# Altium integrated library WCAP-AIL5_rev15a.intlib: 39 symbols
Pins are listed as number, name and electrical type; pins without a type are passive.

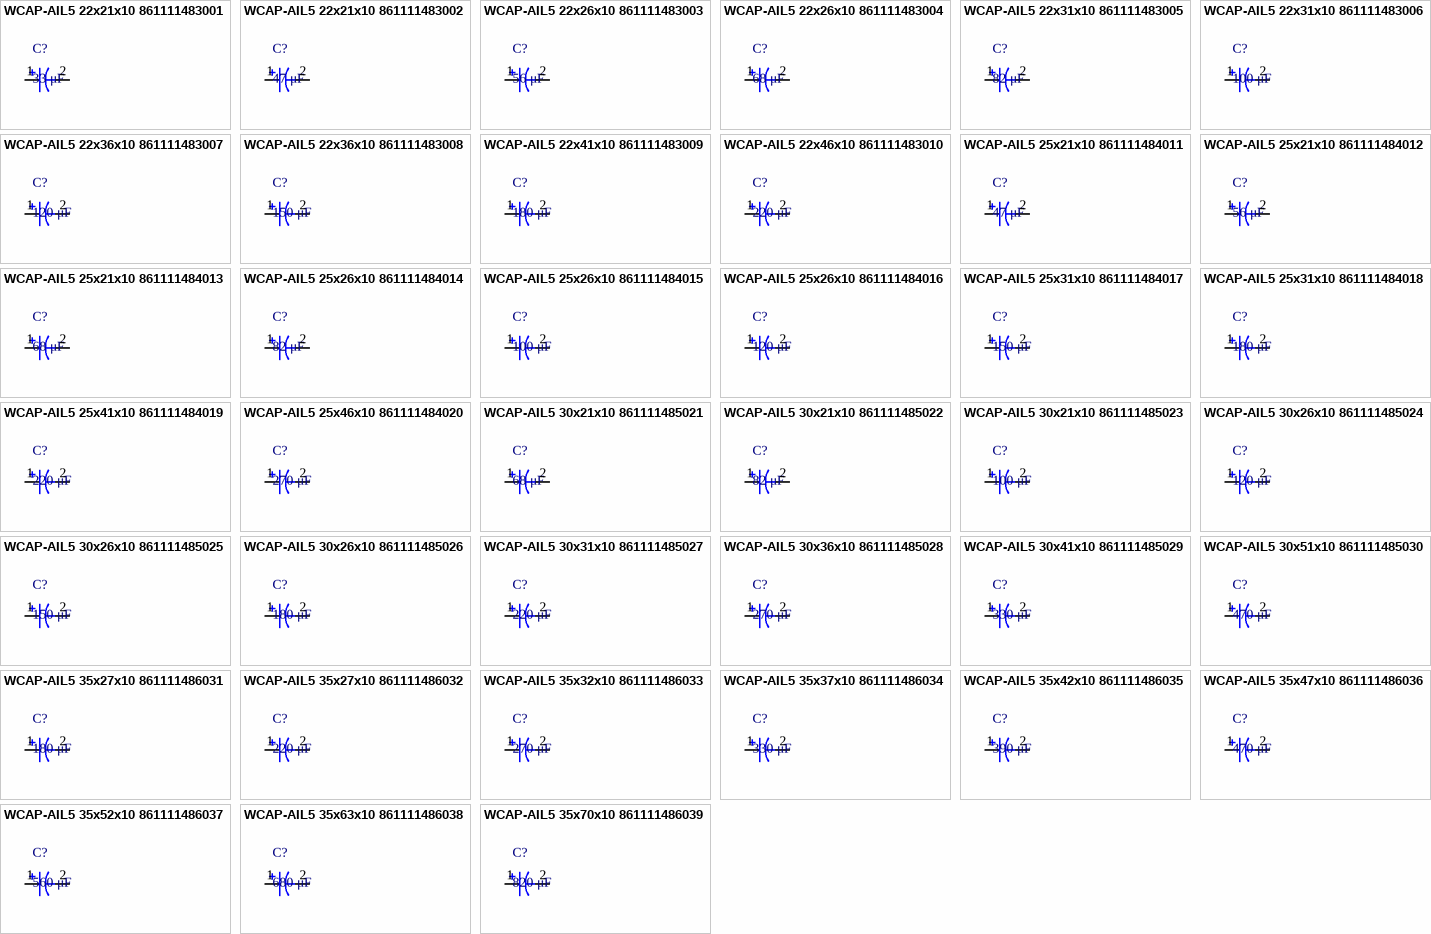
[diagram p0: symbols WCAP-AIL5 22x21x10 861111483001 to WCAP-AIL5 35x70x10 861111486039]

## WCAP-AIL5 22x21x10 861111483001
designator C?, comment 33 μF
WCAP-AIL5 Aluminum Electrolytic Capacitors , 33 μF; + / - 20%; 450 V , 22 x 21; Manufacturer: Wurth Elektronik; partNo: 861111483001; E-mail: libraries@we-online.com; Characteristics: Aluminum Electrolytic Capacitor; Recommended soldering: Wave; Operating temperature: –25 °C to +105 °C; Miniaturized product series; High permissible ripple current; Load life: 2000 h @ +105 °C; ComponentLink1Description: Manufacturer; ComponentLink1URL: http://www.we-online.com; ComponentLink2Description: Datasheet; ComponentLink2URL: http://katalog.we-online.de/pbs/datasheet/861111483001.pdf; Created by: Karrer Zheng; Created Date: 6/8/2015; Capacitance: 33 μF; Application: Medium and high voltage type range from 160V-450V used as primary side input filter in power supply, which can be used in general switching power supply, PC power supply and industrial computer power supply,server power supply, AC-DC converter, motor drive circuit DC storage filter, digital audio, digital TV, communication base station, DC-AC inverter, inverter power supply and converters etc
footprint WCAP-AIL5 22x21x10
pins: 1, 2

## WCAP-AIL5 22x21x10 861111483002
designator C?, comment 47 μF
WCAP-AIL5 Aluminum Electrolytic Capacitors , 47 μF; + / - 20%; 450 V , 22 x 21; Manufacturer: Wurth Elektronik; partNo: 861111483002; E-mail: libraries@we-online.com; Characteristics: Aluminum Electrolytic Capacitor; Recommended soldering: Wave; Operating temperature: –25 °C to +105 °C; Miniaturized product series; High permissible ripple current; Load life: 2000 h @ +105 °C; ComponentLink1Description: Manufacturer; ComponentLink1URL: http://www.we-online.com; ComponentLink2Description: Datasheet; ComponentLink2URL: http://katalog.we-online.de/pbs/datasheet/861111483002.pdf; Created by: Karrer Zheng; Created Date: 6/8/2015; Capacitance: 47 μF; Application: Medium and high voltage type range from 160V-450V used as primary side input filter in power supply, which can be used in general switching power supply, PC power supply and industrial computer power supply,server power supply, AC-DC converter, motor drive circuit DC storage filter, digital audio, digital TV, communication base station, DC-AC inverter, inverter power supply and converters etc
footprint WCAP-AIL5 22x21x10
pins: 1, 2

## WCAP-AIL5 22x26x10 861111483003
designator C?, comment 56 μF
WCAP-AIL5 Aluminum Electrolytic Capacitors , 56 μF; + / - 20%; 450 V , 22 x 26; Manufacturer: Wurth Elektronik; partNo: 861111483003; E-mail: libraries@we-online.com; Characteristics: Aluminum Electrolytic Capacitor; Recommended soldering: Wave; Operating temperature: –25 °C to +105 °C; Miniaturized product series; High permissible ripple current; Load life: 2000 h @ +105 °C; ComponentLink1Description: Manufacturer; ComponentLink1URL: http://www.we-online.com; ComponentLink2Description: Datasheet; ComponentLink2URL: http://katalog.we-online.de/pbs/datasheet/861111483003.pdf; Created by: Karrer Zheng; Created Date: 6/8/2015; Capacitance: 56 μF; Application: Medium and high voltage type range from 160V-450V used as primary side input filter in power supply, which can be used in general switching power supply, PC power supply and industrial computer power supply,server power supply, AC-DC converter, motor drive circuit DC storage filter, digital audio, digital TV, communication base station, DC-AC inverter, inverter power supply and converters etc
footprint WCAP-AIL5 22x26x10
pins: 1, 2

## WCAP-AIL5 22x26x10 861111483004
designator C?, comment 68 μF
WCAP-AIL5 Aluminum Electrolytic Capacitors , 68 μF; + / - 20%; 450 V , 22 x 26; Manufacturer: Wurth Elektronik; partNo: 861111483004; E-mail: libraries@we-online.com; Characteristics: Aluminum Electrolytic Capacitor; Recommended soldering: Wave; Operating temperature: –25 °C to +105 °C; Miniaturized product series; High permissible ripple current; Load life: 2000 h @ +105 °C; ComponentLink1Description: Manufacturer; ComponentLink1URL: http://www.we-online.com; ComponentLink2Description: Datasheet; ComponentLink2URL: http://katalog.we-online.de/pbs/datasheet/861111483004.pdf; Created by: Karrer Zheng; Created Date: 6/8/2015; Capacitance: 68 μF; Application: Medium and high voltage type range from 160V-450V used as primary side input filter in power supply, which can be used in general switching power supply, PC power supply and industrial computer power supply,server power supply, AC-DC converter, motor drive circuit DC storage filter, digital audio, digital TV, communication base station, DC-AC inverter, inverter power supply and converters etc
footprint WCAP-AIL5 22x26x10
pins: 1, 2

## WCAP-AIL5 22x31x10 861111483005
designator C?, comment 82 μF
WCAP-AIL5 Aluminum Electrolytic Capacitors , 82 μF; + / - 20%; 450 V , 22 x 31; Manufacturer: Wurth Elektronik; partNo: 861111483005; E-mail: libraries@we-online.com; Characteristics: Aluminum Electrolytic Capacitor; Recommended soldering: Wave; Operating temperature: –25 °C to +105 °C; Miniaturized product series; High permissible ripple current; Load life: 2000 h @ +105 °C; ComponentLink1Description: Manufacturer; ComponentLink1URL: http://www.we-online.com; ComponentLink2Description: Datasheet; ComponentLink2URL: http://katalog.we-online.de/pbs/datasheet/861111483005.pdf; Created by: Karrer Zheng; Created Date: 6/8/2015; Capacitance: 82 μF; Application: Medium and high voltage type range from 160V-450V used as primary side input filter in power supply, which can be used in general switching power supply, PC power supply and industrial computer power supply,server power supply, AC-DC converter, motor drive circuit DC storage filter, digital audio, digital TV, communication base station, DC-AC inverter, inverter power supply and converters etc
footprint WCAP-AIL5 22x31x10
pins: 1, 2

## WCAP-AIL5 22x31x10 861111483006
designator C?, comment 100 μF
WCAP-AIL5 Aluminum Electrolytic Capacitors , 100 μF; + / - 20%; 450 V , 22 x 31; Manufacturer: Wurth Elektronik; partNo: 861111483006; E-mail: libraries@we-online.com; Characteristics: Aluminum Electrolytic Capacitor; Recommended soldering: Wave; Operating temperature: –25 °C to +105 °C; Miniaturized product series; High permissible ripple current; Load life: 2000 h @ +105 °C; ComponentLink1Description: Manufacturer; ComponentLink1URL: http://www.we-online.com; ComponentLink2Description: Datasheet; ComponentLink2URL: http://katalog.we-online.de/pbs/datasheet/861111483006.pdf; Created by: Karrer Zheng; Created Date: 6/8/2015; Capacitance: 100 μF; Application: Medium and high voltage type range from 160V-450V used as primary side input filter in power supply, which can be used in general switching power supply, PC power supply and industrial computer power supply,server power supply, AC-DC converter, motor drive circuit DC storage filter, digital audio, digital TV, communication base station, DC-AC inverter, inverter power supply and converters etc
footprint WCAP-AIL5 22x31x10
pins: 1, 2

## WCAP-AIL5 22x36x10 861111483007
designator C?, comment 120 μF
WCAP-AIL5 Aluminum Electrolytic Capacitors , 120 μF; + / - 20%; 450 V , 22 x 36; Manufacturer: Wurth Elektronik; partNo: 861111483007; E-mail: libraries@we-online.com; Characteristics: Aluminum Electrolytic Capacitor; Recommended soldering: Wave; Operating temperature: –25 °C to +105 °C; Miniaturized product series; High permissible ripple current; Load life: 2000 h @ +105 °C; ComponentLink1Description: Manufacturer; ComponentLink1URL: http://www.we-online.com; ComponentLink2Description: Datasheet; ComponentLink2URL: http://katalog.we-online.de/pbs/datasheet/861111483007.pdf; Created by: Karrer Zheng; Created Date: 6/8/2015; Capacitance: 120 μF; Application: Medium and high voltage type range from 160V-450V used as primary side input filter in power supply, which can be used in general switching power supply, PC power supply and industrial computer power supply,server power supply, AC-DC converter, motor drive circuit DC storage filter, digital audio, digital TV, communication base station, DC-AC inverter, inverter power supply and converters etc
footprint WCAP-AIL5 22x36x10
pins: 1, 2

## WCAP-AIL5 22x36x10 861111483008
designator C?, comment 150 μF
WCAP-AIL5 Aluminum Electrolytic Capacitors , 150 μF; + / - 20%; 450 V , 22 x 36; Manufacturer: Wurth Elektronik; partNo: 861111483008; E-mail: libraries@we-online.com; Characteristics: Aluminum Electrolytic Capacitor; Recommended soldering: Wave; Operating temperature: –25 °C to +105 °C; Miniaturized product series; High permissible ripple current; Load life: 2000 h @ +105 °C; ComponentLink1Description: Manufacturer; ComponentLink1URL: http://www.we-online.com; ComponentLink2Description: Datasheet; ComponentLink2URL: http://katalog.we-online.de/pbs/datasheet/861111483008.pdf; Created by: Karrer Zheng; Created Date: 6/8/2015; Capacitance: 150 μF; Application: Medium and high voltage type range from 160V-450V used as primary side input filter in power supply, which can be used in general switching power supply, PC power supply and industrial computer power supply,server power supply, AC-DC converter, motor drive circuit DC storage filter, digital audio, digital TV, communication base station, DC-AC inverter, inverter power supply and converters etc
footprint WCAP-AIL5 22x36x10
pins: 1, 2

## WCAP-AIL5 22x41x10 861111483009
designator C?, comment 180 μF
WCAP-AIL5 Aluminum Electrolytic Capacitors , 180 μF; + / - 20%; 450 V , 22 x 41; Manufacturer: Wurth Elektronik; partNo: 861111483009; E-mail: libraries@we-online.com; Characteristics: Aluminum Electrolytic Capacitor; Recommended soldering: Wave; Operating temperature: –25 °C to +105 °C; Miniaturized product series; High permissible ripple current; Load life: 2000 h @ +105 °C; ComponentLink1Description: Manufacturer; ComponentLink1URL: http://www.we-online.com; ComponentLink2Description: Datasheet; ComponentLink2URL: http://katalog.we-online.de/pbs/datasheet/861111483009.pdf; Created by: Karrer Zheng; Created Date: 6/8/2015; Capacitance: 180 μF; Application: Medium and high voltage type range from 160V-450V used as primary side input filter in power supply, which can be used in general switching power supply, PC power supply and industrial computer power supply,server power supply, AC-DC converter, motor drive circuit DC storage filter, digital audio, digital TV, communication base station, DC-AC inverter, inverter power supply and converters etc
footprint WCAP-AIL5 22x41x10
pins: 1, 2

## WCAP-AIL5 22x46x10 861111483010
designator C?, comment 220 μF
WCAP-AIL5 Aluminum Electrolytic Capacitors , 220 μF; + / - 20%; 450 V , 22 x 46; Manufacturer: Wurth Elektronik; partNo: 861111483010; E-mail: libraries@we-online.com; Characteristics: Aluminum Electrolytic Capacitor; Recommended soldering: Wave; Operating temperature: –25 °C to +105 °C; Miniaturized product series; High permissible ripple current; Load life: 2000 h @ +105 °C; ComponentLink1Description: Manufacturer; ComponentLink1URL: http://www.we-online.com; ComponentLink2Description: Datasheet; ComponentLink2URL: http://katalog.we-online.de/pbs/datasheet/861111483010.pdf; Created by: Karrer Zheng; Created Date: 6/8/2015; Capacitance: 220 μF; Application: Medium and high voltage type range from 160V-450V used as primary side input filter in power supply, which can be used in general switching power supply, PC power supply and industrial computer power supply,server power supply, AC-DC converter, motor drive circuit DC storage filter, digital audio, digital TV, communication base station, DC-AC inverter, inverter power supply and converters etc
footprint WCAP-AIL5 22x46x10
pins: 1, 2

## WCAP-AIL5 25x21x10 861111484011
designator C?, comment 47 μF
WCAP-AIL5 Aluminum Electrolytic Capacitors , 47 μF; + / - 20%; 450 V , 25 x 21; Manufacturer: Wurth Elektronik; partNo: 861111484011; E-mail: libraries@we-online.com; Characteristics: Aluminum Electrolytic Capacitor; Recommended soldering: Wave; Operating temperature: –25 °C to +105 °C; Miniaturized product series; High permissible ripple current; Load life: 2000 h @ +105 °C; ComponentLink1Description: Manufacturer; ComponentLink1URL: http://www.we-online.com; ComponentLink2Description: Datasheet; ComponentLink2URL: http://katalog.we-online.de/pbs/datasheet/861111484011.pdf; Created by: Karrer Zheng; Created Date: 6/8/2015; Capacitance: 47 μF; Application: Medium and high voltage type range from 160V-450V used as primary side input filter in power supply, which can be used in general switching power supply, PC power supply and industrial computer power supply,server power supply, AC-DC converter, motor drive circuit DC storage filter, digital audio, digital TV, communication base station, DC-AC inverter, inverter power supply and converters etc
footprint WCAP-AIL5 25x21x10
pins: 1, 2

## WCAP-AIL5 25x21x10 861111484012
designator C?, comment 56 μF
WCAP-AIL5 Aluminum Electrolytic Capacitors , 56 μF; + / - 20%; 450 V , 25 x 21; Manufacturer: Wurth Elektronik; partNo: 861111484012; E-mail: libraries@we-online.com; Characteristics: Aluminum Electrolytic Capacitor; Recommended soldering: Wave; Operating temperature: –25 °C to +105 °C; Miniaturized product series; High permissible ripple current; Load life: 2000 h @ +105 °C; ComponentLink1Description: Manufacturer; ComponentLink1URL: http://www.we-online.com; ComponentLink2Description: Datasheet; ComponentLink2URL: http://katalog.we-online.de/pbs/datasheet/861111484012.pdf; Created by: Karrer Zheng; Created Date: 6/8/2015; Capacitance: 56 μF; Application: Medium and high voltage type range from 160V-450V used as primary side input filter in power supply, which can be used in general switching power supply, PC power supply and industrial computer power supply,server power supply, AC-DC converter, motor drive circuit DC storage filter, digital audio, digital TV, communication base station, DC-AC inverter, inverter power supply and converters etc
footprint WCAP-AIL5 25x21x10
pins: 1, 2

## WCAP-AIL5 25x21x10 861111484013
designator C?, comment 68 μF
WCAP-AIL5 Aluminum Electrolytic Capacitors , 68 μF; + / - 20%; 450 V , 25 x 21; Manufacturer: Wurth Elektronik; partNo: 861111484013; E-mail: libraries@we-online.com; Characteristics: Aluminum Electrolytic Capacitor; Recommended soldering: Wave; Operating temperature: –25 °C to +105 °C; Miniaturized product series; High permissible ripple current; Load life: 2000 h @ +105 °C; ComponentLink1Description: Manufacturer; ComponentLink1URL: http://www.we-online.com; ComponentLink2Description: Datasheet; ComponentLink2URL: http://katalog.we-online.de/pbs/datasheet/861111484013.pdf; Created by: Karrer Zheng; Created Date: 6/8/2015; Capacitance: 68 μF; Application: Medium and high voltage type range from 160V-450V used as primary side input filter in power supply, which can be used in general switching power supply, PC power supply and industrial computer power supply,server power supply, AC-DC converter, motor drive circuit DC storage filter, digital audio, digital TV, communication base station, DC-AC inverter, inverter power supply and converters etc
footprint WCAP-AIL5 25x21x10
pins: 1, 2

## WCAP-AIL5 25x26x10 861111484014
designator C?, comment 82 μF
WCAP-AIL5 Aluminum Electrolytic Capacitors , 82 μF; + / - 20%; 450 V , 25 x 26; Manufacturer: Wurth Elektronik; partNo: 861111484014; E-mail: libraries@we-online.com; Characteristics: Aluminum Electrolytic Capacitor; Recommended soldering: Wave; Operating temperature: –25 °C to +105 °C; Miniaturized product series; High permissible ripple current; Load life: 2000 h @ +105 °C; ComponentLink1Description: Manufacturer; ComponentLink1URL: http://www.we-online.com; ComponentLink2Description: Datasheet; ComponentLink2URL: http://katalog.we-online.de/pbs/datasheet/861111484014.pdf; Created by: Karrer Zheng; Created Date: 6/8/2015; Capacitance: 82 μF; Application: Medium and high voltage type range from 160V-450V used as primary side input filter in power supply, which can be used in general switching power supply, PC power supply and industrial computer power supply,server power supply, AC-DC converter, motor drive circuit DC storage filter, digital audio, digital TV, communication base station, DC-AC inverter, inverter power supply and converters etc
footprint WCAP-AIL5 25x26x10
pins: 1, 2

## WCAP-AIL5 25x26x10 861111484015
designator C?, comment 100 μF
WCAP-AIL5 Aluminum Electrolytic Capacitors , 100 μF; + / - 20%; 450 V , 25 x 26; Manufacturer: Wurth Elektronik; partNo: 861111484015; E-mail: libraries@we-online.com; Characteristics: Aluminum Electrolytic Capacitor; Recommended soldering: Wave; Operating temperature: –25 °C to +105 °C; Miniaturized product series; High permissible ripple current; Load life: 2000 h @ +105 °C; ComponentLink1Description: Manufacturer; ComponentLink1URL: http://www.we-online.com; ComponentLink2Description: Datasheet; ComponentLink2URL: http://katalog.we-online.de/pbs/datasheet/861111484015.pdf; Created by: Karrer Zheng; Created Date: 6/8/2015; Capacitance: 100 μF; Application: Medium and high voltage type range from 160V-450V used as primary side input filter in power supply, which can be used in general switching power supply, PC power supply and industrial computer power supply,server power supply, AC-DC converter, motor drive circuit DC storage filter, digital audio, digital TV, communication base station, DC-AC inverter, inverter power supply and converters etc
footprint WCAP-AIL5 25x26x10
pins: 1, 2

## WCAP-AIL5 25x26x10 861111484016
designator C?, comment 120 μF
WCAP-AIL5 Aluminum Electrolytic Capacitors , 120 μF; + / - 20%; 450 V , 25 x 26; Manufacturer: Wurth Elektronik; partNo: 861111484016; E-mail: libraries@we-online.com; Characteristics: Aluminum Electrolytic Capacitor; Recommended soldering: Wave; Operating temperature: –25 °C to +105 °C; Miniaturized product series; High permissible ripple current; Load life: 2000 h @ +105 °C; ComponentLink1Description: Manufacturer; ComponentLink1URL: http://www.we-online.com; ComponentLink2Description: Datasheet; ComponentLink2URL: http://katalog.we-online.de/pbs/datasheet/861111484016.pdf; Created by: Karrer Zheng; Created Date: 6/8/2015; Capacitance: 120 μF; Application: Medium and high voltage type range from 160V-450V used as primary side input filter in power supply, which can be used in general switching power supply, PC power supply and industrial computer power supply,server power supply, AC-DC converter, motor drive circuit DC storage filter, digital audio, digital TV, communication base station, DC-AC inverter, inverter power supply and converters etc
footprint WCAP-AIL5 25x26x10
pins: 1, 2

## WCAP-AIL5 25x31x10 861111484017
designator C?, comment 150 μF
WCAP-AIL5 Aluminum Electrolytic Capacitors , 150 μF; + / - 20%; 450 V , 25 x 31; Manufacturer: Wurth Elektronik; partNo: 861111484017; E-mail: libraries@we-online.com; Characteristics: Aluminum Electrolytic Capacitor; Recommended soldering: Wave; Operating temperature: –25 °C to +105 °C; Miniaturized product series; High permissible ripple current; Load life: 2000 h @ +105 °C; ComponentLink1Description: Manufacturer; ComponentLink1URL: http://www.we-online.com; ComponentLink2Description: Datasheet; ComponentLink2URL: http://katalog.we-online.de/pbs/datasheet/861111484017.pdf; Created by: Karrer Zheng; Created Date: 6/8/2015; Capacitance: 150 μF; Application: Medium and high voltage type range from 160V-450V used as primary side input filter in power supply, which can be used in general switching power supply, PC power supply and industrial computer power supply,server power supply, AC-DC converter, motor drive circuit DC storage filter, digital audio, digital TV, communication base station, DC-AC inverter, inverter power supply and converters etc
footprint WCAP-AIL5 25x31x10
pins: 1, 2

## WCAP-AIL5 25x31x10 861111484018
designator C?, comment 180 μF
WCAP-AIL5 Aluminum Electrolytic Capacitors , 180 μF; + / - 20%; 450 V , 25 x 31; Manufacturer: Wurth Elektronik; partNo: 861111484018; E-mail: libraries@we-online.com; Characteristics: Aluminum Electrolytic Capacitor; Recommended soldering: Wave; Operating temperature: –25 °C to +105 °C; Miniaturized product series; High permissible ripple current; Load life: 2000 h @ +105 °C; ComponentLink1Description: Manufacturer; ComponentLink1URL: http://www.we-online.com; ComponentLink2Description: Datasheet; ComponentLink2URL: http://katalog.we-online.de/pbs/datasheet/861111484018.pdf; Created by: Karrer Zheng; Created Date: 6/8/2015; Capacitance: 180 μF; Application: Medium and high voltage type range from 160V-450V used as primary side input filter in power supply, which can be used in general switching power supply, PC power supply and industrial computer power supply,server power supply, AC-DC converter, motor drive circuit DC storage filter, digital audio, digital TV, communication base station, DC-AC inverter, inverter power supply and converters etc
footprint WCAP-AIL5 25x31x10
pins: 1, 2

## WCAP-AIL5 25x41x10 861111484019
designator C?, comment 220 μF
WCAP-AIL5 Aluminum Electrolytic Capacitors , 220 μF; + / - 20%; 450 V , 25 x 41; Manufacturer: Wurth Elektronik; partNo: 861111484019; E-mail: libraries@we-online.com; Characteristics: Aluminum Electrolytic Capacitor; Recommended soldering: Wave; Operating temperature: –25 °C to +105 °C; Miniaturized product series; High permissible ripple current; Load life: 2000 h @ +105 °C; ComponentLink1Description: Manufacturer; ComponentLink1URL: http://www.we-online.com; ComponentLink2Description: Datasheet; ComponentLink2URL: http://katalog.we-online.de/pbs/datasheet/861111484019.pdf; Created by: Karrer Zheng; Created Date: 6/8/2015; Capacitance: 220 μF; Application: Medium and high voltage type range from 160V-450V used as primary side input filter in power supply, which can be used in general switching power supply, PC power supply and industrial computer power supply,server power supply, AC-DC converter, motor drive circuit DC storage filter, digital audio, digital TV, communication base station, DC-AC inverter, inverter power supply and converters etc
footprint WCAP-AIL5 25x41x10
pins: 1, 2

## WCAP-AIL5 25x46x10 861111484020
designator C?, comment 270 μF
WCAP-AIL5 Aluminum Electrolytic Capacitors , 270 μF; + / - 20%; 450 V , 25 x 46; Manufacturer: Wurth Elektronik; partNo: 861111484020; E-mail: libraries@we-online.com; Characteristics: Aluminum Electrolytic Capacitor; Recommended soldering: Wave; Operating temperature: –25 °C to +105 °C; Miniaturized product series; High permissible ripple current; Load life: 2000 h @ +105 °C; ComponentLink1Description: Manufacturer; ComponentLink1URL: http://www.we-online.com; ComponentLink2Description: Datasheet; ComponentLink2URL: http://katalog.we-online.de/pbs/datasheet/861111484020.pdf; Created by: Karrer Zheng; Created Date: 6/8/2015; Capacitance: 270 μF; Application: Medium and high voltage type range from 160V-450V used as primary side input filter in power supply, which can be used in general switching power supply, PC power supply and industrial computer power supply,server power supply, AC-DC converter, motor drive circuit DC storage filter, digital audio, digital TV, communication base station, DC-AC inverter, inverter power supply and converters etc
footprint WCAP-AIL5 25x46x10
pins: 1, 2

## WCAP-AIL5 30x21x10 861111485021
designator C?, comment 68 μF
WCAP-AIL5 Aluminum Electrolytic Capacitors , 68 μF; + / - 20%; 450 V , 30 x 21; Manufacturer: Wurth Elektronik; partNo: 861111485021; E-mail: libraries@we-online.com; Characteristics: Aluminum Electrolytic Capacitor; Recommended soldering: Wave; Operating temperature: –25 °C to +105 °C; Miniaturized product series; High permissible ripple current; Load life: 2000 h @ +105 °C; ComponentLink1Description: Manufacturer; ComponentLink1URL: http://www.we-online.com; ComponentLink2Description: Datasheet; ComponentLink2URL: http://katalog.we-online.de/pbs/datasheet/861111485021.pdf; Created by: Karrer Zheng; Created Date: 6/8/2015; Capacitance: 68 μF; Application: Medium and high voltage type range from 160V-450V used as primary side input filter in power supply, which can be used in general switching power supply, PC power supply and industrial computer power supply,server power supply, AC-DC converter, motor drive circuit DC storage filter, digital audio, digital TV, communication base station, DC-AC inverter, inverter power supply and converters etc
footprint WCAP-AIL5 30x21x10
pins: 1, 2

## WCAP-AIL5 30x21x10 861111485022
designator C?, comment 82 μF
WCAP-AIL5 Aluminum Electrolytic Capacitors , 82 μF; + / - 20%; 450 V , 30 x 21; Manufacturer: Wurth Elektronik; partNo: 861111485022; E-mail: libraries@we-online.com; Characteristics: Aluminum Electrolytic Capacitor; Recommended soldering: Wave; Operating temperature: –25 °C to +105 °C; Miniaturized product series; High permissible ripple current; Load life: 2000 h @ +105 °C; ComponentLink1Description: Manufacturer; ComponentLink1URL: http://www.we-online.com; ComponentLink2Description: Datasheet; ComponentLink2URL: http://katalog.we-online.de/pbs/datasheet/861111485022.pdf; Created by: Karrer Zheng; Created Date: 6/8/2015; Capacitance: 82 μF; Application: Medium and high voltage type range from 160V-450V used as primary side input filter in power supply, which can be used in general switching power supply, PC power supply and industrial computer power supply,server power supply, AC-DC converter, motor drive circuit DC storage filter, digital audio, digital TV, communication base station, DC-AC inverter, inverter power supply and converters etc
footprint WCAP-AIL5 30x21x10
pins: 1, 2

## WCAP-AIL5 30x21x10 861111485023
designator C?, comment 100 μF
WCAP-AIL5 Aluminum Electrolytic Capacitors , 100 μF; + / - 20%; 450 V , 30 x 21; Manufacturer: Wurth Elektronik; partNo: 861111485023; E-mail: libraries@we-online.com; Characteristics: Aluminum Electrolytic Capacitor; Recommended soldering: Wave; Operating temperature: –25 °C to +105 °C; Miniaturized product series; High permissible ripple current; Load life: 2000 h @ +105 °C; ComponentLink1Description: Manufacturer; ComponentLink1URL: http://www.we-online.com; ComponentLink2Description: Datasheet; ComponentLink2URL: http://katalog.we-online.de/pbs/datasheet/861111485023.pdf; Created by: Karrer Zheng; Created Date: 6/8/2015; Capacitance: 100 μF; Application: Medium and high voltage type range from 160V-450V used as primary side input filter in power supply, which can be used in general switching power supply, PC power supply and industrial computer power supply,server power supply, AC-DC converter, motor drive circuit DC storage filter, digital audio, digital TV, communication base station, DC-AC inverter, inverter power supply and converters etc
footprint WCAP-AIL5 30x21x10
pins: 1, 2

## WCAP-AIL5 30x26x10 861111485024
designator C?, comment 120 μF
WCAP-AIL5 Aluminum Electrolytic Capacitors , 120 μF; + / - 20%; 450 V , 30 x 26; Manufacturer: Wurth Elektronik; partNo: 861111485024; E-mail: libraries@we-online.com; Characteristics: Aluminum Electrolytic Capacitor; Recommended soldering: Wave; Operating temperature: –25 °C to +105 °C; Miniaturized product series; High permissible ripple current; Load life: 2000 h @ +105 °C; ComponentLink1Description: Manufacturer; ComponentLink1URL: http://www.we-online.com; ComponentLink2Description: Datasheet; ComponentLink2URL: http://katalog.we-online.de/pbs/datasheet/861111485024.pdf; Created by: Karrer Zheng; Created Date: 6/8/2015; Capacitance: 120 μF; Application: Medium and high voltage type range from 160V-450V used as primary side input filter in power supply, which can be used in general switching power supply, PC power supply and industrial computer power supply,server power supply, AC-DC converter, motor drive circuit DC storage filter, digital audio, digital TV, communication base station, DC-AC inverter, inverter power supply and converters etc
footprint WCAP-AIL5 30x26x10
pins: 1, 2

## WCAP-AIL5 30x26x10 861111485025
designator C?, comment 150 μF
WCAP-AIL5 Aluminum Electrolytic Capacitors , 150 μF; + / - 20%; 450 V , 30 x 26; Manufacturer: Wurth Elektronik; partNo: 861111485025; E-mail: libraries@we-online.com; Characteristics: Aluminum Electrolytic Capacitor; Recommended soldering: Wave; Operating temperature: –25 °C to +105 °C; Miniaturized product series; High permissible ripple current; Load life: 2000 h @ +105 °C; ComponentLink1Description: Manufacturer; ComponentLink1URL: http://www.we-online.com; ComponentLink2Description: Datasheet; ComponentLink2URL: http://katalog.we-online.de/pbs/datasheet/861111485025.pdf; Created by: Karrer Zheng; Created Date: 6/8/2015; Capacitance: 150 μF; Application: Medium and high voltage type range from 160V-450V used as primary side input filter in power supply, which can be used in general switching power supply, PC power supply and industrial computer power supply,server power supply, AC-DC converter, motor drive circuit DC storage filter, digital audio, digital TV, communication base station, DC-AC inverter, inverter power supply and converters etc
footprint WCAP-AIL5 30x26x10
pins: 1, 2

## WCAP-AIL5 30x26x10 861111485026
designator C?, comment 180 μF
WCAP-AIL5 Aluminum Electrolytic Capacitors , 180 μF; + / - 20%; 450 V , 30 x 26; Manufacturer: Wurth Elektronik; partNo: 861111485026; E-mail: libraries@we-online.com; Characteristics: Aluminum Electrolytic Capacitor; Recommended soldering: Wave; Operating temperature: –25 °C to +105 °C; Miniaturized product series; High permissible ripple current; Load life: 2000 h @ +105 °C; ComponentLink1Description: Manufacturer; ComponentLink1URL: http://www.we-online.com; ComponentLink2Description: Datasheet; ComponentLink2URL: http://katalog.we-online.de/pbs/datasheet/861111485026.pdf; Created by: Karrer Zheng; Created Date: 6/8/2015; Capacitance: 180 μF; Application: Medium and high voltage type range from 160V-450V used as primary side input filter in power supply, which can be used in general switching power supply, PC power supply and industrial computer power supply,server power supply, AC-DC converter, motor drive circuit DC storage filter, digital audio, digital TV, communication base station, DC-AC inverter, inverter power supply and converters etc
footprint WCAP-AIL5 30x26x10
pins: 1, 2

## WCAP-AIL5 30x31x10 861111485027
designator C?, comment 220 μF
WCAP-AIL5 Aluminum Electrolytic Capacitors , 220 μF; + / - 20%; 450 V , 30 x 31; Manufacturer: Wurth Elektronik; partNo: 861111485027; E-mail: libraries@we-online.com; Characteristics: Aluminum Electrolytic Capacitor; Recommended soldering: Wave; Operating temperature: –25 °C to +105 °C; Miniaturized product series; High permissible ripple current; Load life: 2000 h @ +105 °C; ComponentLink1Description: Manufacturer; ComponentLink1URL: http://www.we-online.com; ComponentLink2Description: Datasheet; ComponentLink2URL: http://katalog.we-online.de/pbs/datasheet/861111485027.pdf; Created by: Karrer Zheng; Created Date: 6/8/2015; Capacitance: 220 μF; Application: Medium and high voltage type range from 160V-450V used as primary side input filter in power supply, which can be used in general switching power supply, PC power supply and industrial computer power supply,server power supply, AC-DC converter, motor drive circuit DC storage filter, digital audio, digital TV, communication base station, DC-AC inverter, inverter power supply and converters etc
footprint WCAP-AIL5 30x31x10
pins: 1, 2

## WCAP-AIL5 30x36x10 861111485028
designator C?, comment 270 μF
WCAP-AIL5 Aluminum Electrolytic Capacitors , 270 μF; + / - 20%; 450 V , 30 x 36; Manufacturer: Wurth Elektronik; partNo: 861111485028; E-mail: libraries@we-online.com; Characteristics: Aluminum Electrolytic Capacitor; Recommended soldering: Wave; Operating temperature: –25 °C to +105 °C; Miniaturized product series; High permissible ripple current; Load life: 2000 h @ +105 °C; ComponentLink1Description: Manufacturer; ComponentLink1URL: http://www.we-online.com; ComponentLink2Description: Datasheet; ComponentLink2URL: http://katalog.we-online.de/pbs/datasheet/861111485028.pdf; Created by: Karrer Zheng; Created Date: 6/8/2015; Capacitance: 270 μF; Application: Medium and high voltage type range from 160V-450V used as primary side input filter in power supply, which can be used in general switching power supply, PC power supply and industrial computer power supply,server power supply, AC-DC converter, motor drive circuit DC storage filter, digital audio, digital TV, communication base station, DC-AC inverter, inverter power supply and converters etc
footprint WCAP-AIL5 30x36x10
pins: 1, 2

## WCAP-AIL5 30x41x10 861111485029
designator C?, comment 330 μF
WCAP-AIL5 Aluminum Electrolytic Capacitors , 330 μF; + / - 20%; 450 V , 30 x 41; Manufacturer: Wurth Elektronik; partNo: 861111485029; E-mail: libraries@we-online.com; Characteristics: Aluminum Electrolytic Capacitor; Recommended soldering: Wave; Operating temperature: –25 °C to +105 °C; Miniaturized product series; High permissible ripple current; Load life: 2000 h @ +105 °C; ComponentLink1Description: Manufacturer; ComponentLink1URL: http://www.we-online.com; ComponentLink2Description: Datasheet; ComponentLink2URL: http://katalog.we-online.de/pbs/datasheet/861111485029.pdf; Created by: Karrer Zheng; Created Date: 6/8/2015; Capacitance: 330 μF; Application: Medium and high voltage type range from 160V-450V used as primary side input filter in power supply, which can be used in general switching power supply, PC power supply and industrial computer power supply,server power supply, AC-DC converter, motor drive circuit DC storage filter, digital audio, digital TV, communication base station, DC-AC inverter, inverter power supply and converters etc
footprint WCAP-AIL5 30x41x10
pins: 1, 2

## WCAP-AIL5 30x51x10 861111485030
designator C?, comment 470 μF
WCAP-AIL5 Aluminum Electrolytic Capacitors , 470 μF; + / - 20%; 450 V , 30 x 51; Manufacturer: Wurth Elektronik; partNo: 861111485030; E-mail: libraries@we-online.com; Characteristics: Aluminum Electrolytic Capacitor; Recommended soldering: Wave; Operating temperature: –25 °C to +105 °C; Miniaturized product series; High permissible ripple current; Load life: 2000 h @ +105 °C; ComponentLink1Description: Manufacturer; ComponentLink1URL: http://www.we-online.com; ComponentLink2Description: Datasheet; ComponentLink2URL: http://katalog.we-online.de/pbs/datasheet/861111485030.pdf; Created by: Karrer Zheng; Created Date: 6/8/2015; Capacitance: 470 μF; Application: Medium and high voltage type range from 160V-450V used as primary side input filter in power supply, which can be used in general switching power supply, PC power supply and industrial computer power supply,server power supply, AC-DC converter, motor drive circuit DC storage filter, digital audio, digital TV, communication base station, DC-AC inverter, inverter power supply and converters etc
footprint WCAP-AIL5 30x51x10
pins: 1, 2

## WCAP-AIL5 35x27x10 861111486031
designator C?, comment 180 μF
WCAP-AIL5 Aluminum Electrolytic Capacitors , 180 μF; + / - 20%; 450 V , 35 x 27; Manufacturer: Wurth Elektronik; partNo: 861111486031; E-mail: libraries@we-online.com; Characteristics: Aluminum Electrolytic Capacitor; Recommended soldering: Wave; Operating temperature: –25 °C to +105 °C; Miniaturized product series; High permissible ripple current; Load life: 2000 h @ +105 °C; ComponentLink1Description: Manufacturer; ComponentLink1URL: http://www.we-online.com; ComponentLink2Description: Datasheet; ComponentLink2URL: http://katalog.we-online.de/pbs/datasheet/861111486031.pdf; Created by: Karrer Zheng; Created Date: 6/8/2015; Capacitance: 180 μF; Application: Medium and high voltage type range from 160V-450V used as primary side input filter in power supply, which can be used in general switching power supply, PC power supply and industrial computer power supply,server power supply, AC-DC converter, motor drive circuit DC storage filter, digital audio, digital TV, communication base station, DC-AC inverter, inverter power supply and converters etc
footprint WCAP-AIL5 35x27x10
pins: 1, 2

## WCAP-AIL5 35x27x10 861111486032
designator C?, comment 220 μF
WCAP-AIL5 Aluminum Electrolytic Capacitors , 220 μF; + / - 20%; 450 V , 35 x 27; Manufacturer: Wurth Elektronik; partNo: 861111486032; E-mail: libraries@we-online.com; Characteristics: Aluminum Electrolytic Capacitor; Recommended soldering: Wave; Operating temperature: –25 °C to +105 °C; Miniaturized product series; High permissible ripple current; Load life: 2000 h @ +105 °C; ComponentLink1Description: Manufacturer; ComponentLink1URL: http://www.we-online.com; ComponentLink2Description: Datasheet; ComponentLink2URL: http://katalog.we-online.de/pbs/datasheet/861111486032.pdf; Created by: Karrer Zheng; Created Date: 6/8/2015; Capacitance: 220 μF; Application: Medium and high voltage type range from 160V-450V used as primary side input filter in power supply, which can be used in general switching power supply, PC power supply and industrial computer power supply,server power supply, AC-DC converter, motor drive circuit DC storage filter, digital audio, digital TV, communication base station, DC-AC inverter, inverter power supply and converters etc
footprint WCAP-AIL5 35x27x10
pins: 1, 2

## WCAP-AIL5 35x32x10 861111486033
designator C?, comment 270 μF
WCAP-AIL5 Aluminum Electrolytic Capacitors , 270 μF; + / - 20%; 450 V , 35 x 32; Manufacturer: Wurth Elektronik; partNo: 861111486033; E-mail: libraries@we-online.com; Characteristics: Aluminum Electrolytic Capacitor; Recommended soldering: Wave; Operating temperature: –25 °C to +105 °C; Miniaturized product series; High permissible ripple current; Load life: 2000 h @ +105 °C; ComponentLink1Description: Manufacturer; ComponentLink1URL: http://www.we-online.com; ComponentLink2Description: Datasheet; ComponentLink2URL: http://katalog.we-online.de/pbs/datasheet/861111486033.pdf; Created by: Karrer Zheng; Created Date: 6/8/2015; Capacitance: 270 μF; Application: Medium and high voltage type range from 160V-450V used as primary side input filter in power supply, which can be used in general switching power supply, PC power supply and industrial computer power supply,server power supply, AC-DC converter, motor drive circuit DC storage filter, digital audio, digital TV, communication base station, DC-AC inverter, inverter power supply and converters etc
footprint WCAP-AIL5 35x32x10
pins: 1, 2

## WCAP-AIL5 35x37x10 861111486034
designator C?, comment 330 μF
WCAP-AIL5 Aluminum Electrolytic Capacitors , 330 μF; + / - 20%; 450 V , 35 x 37; Manufacturer: Wurth Elektronik; partNo: 861111486034; E-mail: libraries@we-online.com; Characteristics: Aluminum Electrolytic Capacitor; Recommended soldering: Wave; Operating temperature: –25 °C to +105 °C; Miniaturized product series; High permissible ripple current; Load life: 2000 h @ +105 °C; ComponentLink1Description: Manufacturer; ComponentLink1URL: http://www.we-online.com; ComponentLink2Description: Datasheet; ComponentLink2URL: http://katalog.we-online.de/pbs/datasheet/861111486034.pdf; Created by: Karrer Zheng; Created Date: 6/8/2015; Capacitance: 330 μF; Application: Medium and high voltage type range from 160V-450V used as primary side input filter in power supply, which can be used in general switching power supply, PC power supply and industrial computer power supply,server power supply, AC-DC converter, motor drive circuit DC storage filter, digital audio, digital TV, communication base station, DC-AC inverter, inverter power supply and converters etc
footprint WCAP-AIL5 35x37x10
pins: 1, 2

## WCAP-AIL5 35x42x10 861111486035
designator C?, comment 390 μF
WCAP-AIL5 Aluminum Electrolytic Capacitors , 390 μF; + / - 20%; 450 V , 35 x 42; Manufacturer: Wurth Elektronik; partNo: 861111486035; E-mail: libraries@we-online.com; Characteristics: Aluminum Electrolytic Capacitor; Recommended soldering: Wave; Operating temperature: –25 °C to +105 °C; Miniaturized product series; High permissible ripple current; Load life: 2000 h @ +105 °C; ComponentLink1Description: Manufacturer; ComponentLink1URL: http://www.we-online.com; ComponentLink2Description: Datasheet; ComponentLink2URL: http://katalog.we-online.de/pbs/datasheet/861111486035.pdf; Created by: Karrer Zheng; Created Date: 6/8/2015; Capacitance: 390 μF; Application: Medium and high voltage type range from 160V-450V used as primary side input filter in power supply, which can be used in general switching power supply, PC power supply and industrial computer power supply,server power supply, AC-DC converter, motor drive circuit DC storage filter, digital audio, digital TV, communication base station, DC-AC inverter, inverter power supply and converters etc
footprint WCAP-AIL5 35x42x10
pins: 1, 2

## WCAP-AIL5 35x47x10 861111486036
designator C?, comment 470 μF
WCAP-AIL5 Aluminum Electrolytic Capacitors , 470 μF; + / - 20%; 450 V , 35 x 47; Manufacturer: Wurth Elektronik; partNo: 861111486036; E-mail: libraries@we-online.com; Characteristics: Aluminum Electrolytic Capacitor; Recommended soldering: Wave; Operating temperature: –25 °C to +105 °C; Miniaturized product series; High permissible ripple current; Load life: 2000 h @ +105 °C; ComponentLink1Description: Manufacturer; ComponentLink1URL: http://www.we-online.com; ComponentLink2Description: Datasheet; ComponentLink2URL: http://katalog.we-online.de/pbs/datasheet/861111486036.pdf; Created by: Karrer Zheng; Created Date: 6/8/2015; Capacitance: 470 μF; Application: Medium and high voltage type range from 160V-450V used as primary side input filter in power supply, which can be used in general switching power supply, PC power supply and industrial computer power supply,server power supply, AC-DC converter, motor drive circuit DC storage filter, digital audio, digital TV, communication base station, DC-AC inverter, inverter power supply and converters etc
footprint WCAP-AIL5 35x47x10
pins: 1, 2

## WCAP-AIL5 35x52x10 861111486037
designator C?, comment 560 μF
WCAP-AIL5 Aluminum Electrolytic Capacitors , 560 μF; + / - 20%; 450 V , 35 x 52; Manufacturer: Wurth Elektronik; partNo: 861111486037; E-mail: libraries@we-online.com; Characteristics: Aluminum Electrolytic Capacitor; Recommended soldering: Wave; Operating temperature: –25 °C to +105 °C; Miniaturized product series; High permissible ripple current; Load life: 2000 h @ +105 °C; ComponentLink1Description: Manufacturer; ComponentLink1URL: http://www.we-online.com; ComponentLink2Description: Datasheet; ComponentLink2URL: http://katalog.we-online.de/pbs/datasheet/861111486037.pdf; Created by: Karrer Zheng; Created Date: 6/8/2015; Capacitance: 560 μF; Application: Medium and high voltage type range from 160V-450V used as primary side input filter in power supply, which can be used in general switching power supply, PC power supply and industrial computer power supply,server power supply, AC-DC converter, motor drive circuit DC storage filter, digital audio, digital TV, communication base station, DC-AC inverter, inverter power supply and converters etc
footprint WCAP-AIL5 35x52x10
pins: 1, 2

## WCAP-AIL5 35x63x10 861111486038
designator C?, comment 680 μF
WCAP-AIL5 Aluminum Electrolytic Capacitors , 680 μF; + / - 20%; 450 V , 35 x 63; Manufacturer: Wurth Elektronik; partNo: 861111486038; E-mail: libraries@we-online.com; Characteristics: Aluminum Electrolytic Capacitor; Recommended soldering: Wave; Operating temperature: –25 °C to +105 °C; Miniaturized product series; High permissible ripple current; Load life: 2000 h @ +105 °C; ComponentLink1Description: Manufacturer; ComponentLink1URL: http://www.we-online.com; ComponentLink2Description: Datasheet; ComponentLink2URL: http://katalog.we-online.de/pbs/datasheet/861111486038.pdf; Created by: Karrer Zheng; Created Date: 6/8/2015; Capacitance: 680 μF; Application: Medium and high voltage type range from 160V-450V used as primary side input filter in power supply, which can be used in general switching power supply, PC power supply and industrial computer power supply,server power supply, AC-DC converter, motor drive circuit DC storage filter, digital audio, digital TV, communication base station, DC-AC inverter, inverter power supply and converters etc
footprint WCAP-AIL5 35x63x10
pins: 1, 2

## WCAP-AIL5 35x70x10 861111486039
designator C?, comment 820 μF
WCAP-AIL5 Aluminum Electrolytic Capacitors , 820 μF; + / - 20%; 450 V , 35 x 70; Manufacturer: Wurth Elektronik; partNo: 861111486039; E-mail: libraries@we-online.com; Characteristics: Aluminum Electrolytic Capacitor; Recommended soldering: Wave; Operating temperature: –25 °C to +105 °C; Miniaturized product series; High permissible ripple current; Load life: 2000 h @ +105 °C; ComponentLink1Description: Manufacturer; ComponentLink1URL: http://www.we-online.com; ComponentLink2Description: Datasheet; ComponentLink2URL: http://katalog.we-online.de/pbs/datasheet/861111486039.pdf; Created by: Karrer Zheng; Created Date: 6/8/2015; Capacitance: 820 μF; Application: Medium and high voltage type range from 160V-450V used as primary side input filter in power supply, which can be used in general switching power supply, PC power supply and industrial computer power supply,server power supply, AC-DC converter, motor drive circuit DC storage filter, digital audio, digital TV, communication base station, DC-AC inverter, inverter power supply and converters etc
footprint WCAP-AIL5 35x70x10
pins: 1, 2